# Altium footprint library My Library.PCBLIB: 198 footprints (part 8 of 13)
Each footprint in its own frame and in the unit in brackets; x right, y up, seen from the top. Pads: shape width x height; smd on the part's side, far side on the other; paste and mask are expansions set on the pad; w line width, h text height; cw(c..) or ccw(c..) is an arc to the next point about the centre after c.
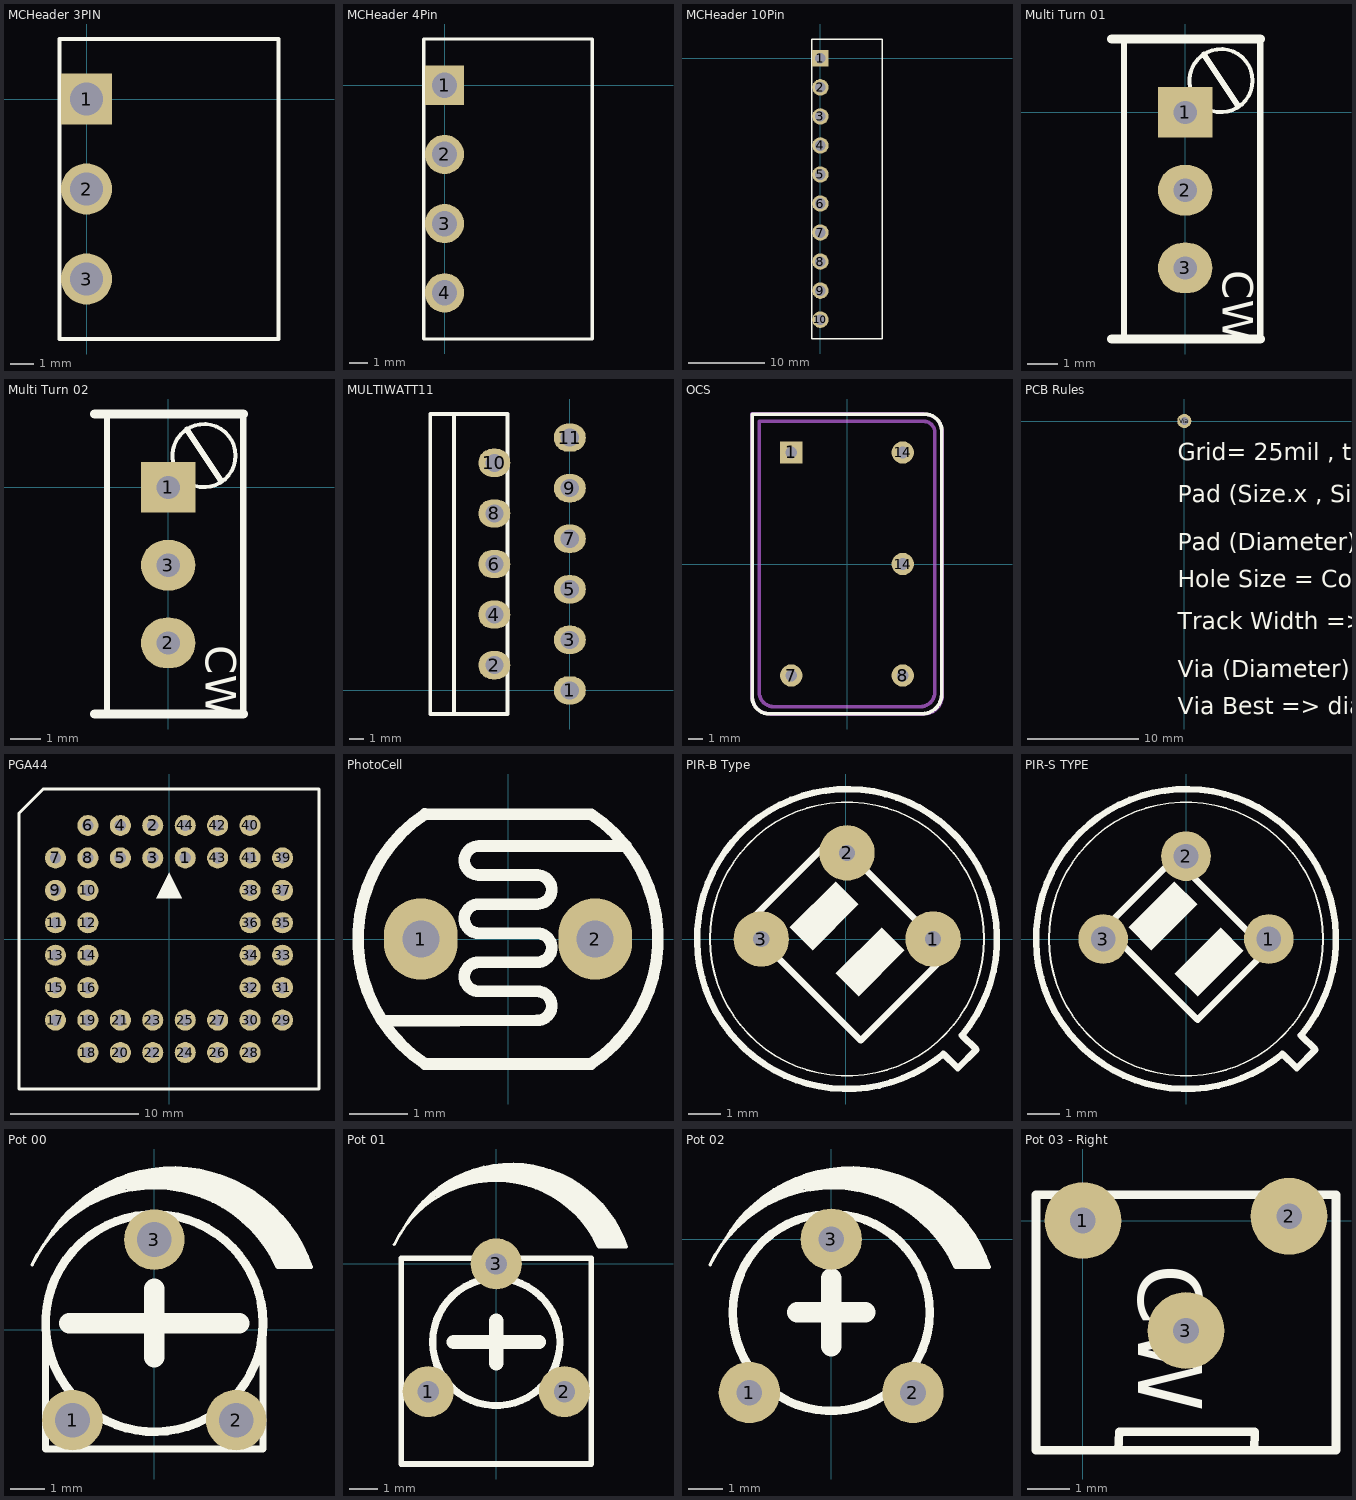
[diagram p7: the footprints below, top view; thin cyan lines are the x and y axes]

## MCHeader 3PIN [mil]
pads (3):
  rect 85x85 hole 55: 1(0,0)
  round 85 hole 55: 2(0,-150) 3(0,-300)
Top Overlay:
  lines w7: -45,-400 -45,100 320,100 320,-400 -45,-400
3D body "mini combicon header 3pin.STEP": height 292.32, standoff -130.12, extent -46.09,-399 318.09,97.85

## MCHeader 4Pin [mil]
pads (4):
  rect 85x85 hole 55: 1(0,0)
  round 85 hole 55: 2(0,-150) 3(0,-300) 4(0,-450)
Top Overlay:
  lines w7: -45,-550 -45,100 320,100 320,-550 -45,-550
3D body "mini combicon header 4pin.STEP": height 292.32, standoff -130.12, extent -49.09,-550.85 315.09,96

## MCHeader 10Pin [mil]
pads (10):
  rect 85x85 hole 55: 1(0,0)
  round 85 hole 55: 2(0,-150) 3(0,-300) 4(0,-450) 5(0,-600) 6(0,-750) 7(0,-900) 8(0,-1050) 9(0,-1200) 10(0,-1350)
Top Overlay:
  lines w7: -45,-1450 320,-1450 320,100 -45,100 -45,-1450
3D body "mini combicon header 10pin.STEP": height 292.32, standoff -130.12, extent -47.09,-1446.85 317.09,100

## Multi Turn 01 [mil] "Stand Multi Turn - Turning CW Increase P1~2 Resistor"
height 472.44
pads (3):
  rect 70x65 hole 30: 1(0,0)
  oval 70x65 hole 30: 2(0,-100) 3(0,-200)
Top Overlay:
  circle w5: c46.03,40.94 r40.58
  lines w7.87: -78.74,-291.34 -78.74,94.49 ; 24.02,74.41 67.72,8.66 ; 96.46,-291.34 96.46,94.49
  lines w11.81: -94.49,-291.34 96.46,-291.34 ; -94.49,94.49 96.46,94.49
  text "CW" at 48,-203 h39.37
3D body "multiturn.STEP": height 452.18, standoff -75.38, extent -73.75,-282.01 92,92.01

## Multi Turn 02 [mil]
pads (3):
  rect 70x65 hole 30: 1(0,0)
  oval 70x65 hole 30: 2(0,-200) 3(0,-100)
Top Overlay:
  circle w5: c46.03,40.94 r40.58
  lines w7.87: -78.74,-291.34 -78.74,94.49 ; 24.02,74.41 67.72,8.66 ; 96.46,-291.34 96.46,94.49
  lines w11.81: -94.49,-291.34 96.46,-291.34 ; -94.49,94.49 96.46,94.49
  text "CW" at 48,-203 h39.37
3D body "multiturn.STEP": height 452.18, standoff -75.38, extent -73.23,-285.04 92.52,88.98

## MULTIWATT11 [mil] "Use For L6203"
height 760
pads (11):
  oval 85x75 hole 48: 1(0,0) 2(-200,67) 3(0,134) 4(-200,201) 5(0,268) 6(-200,335) 7(0,402) 8(-200,469) 9(0,536) 10(-200,603) 11(0,670)
Top Overlay:
  lines w10: -317,732.5 -315,732.5 ; -307,-62.5 -307,732.5 ; -370,-62.5 -165,-62.5 -165,732.5 -370,732.5 -370,-62.5
3D body: height 760, standoff 62, extent -368,-61 -307,731
3D body: height 42, standoff 20, extent -254,-18 11,19
3D body: height 62, standoff 42, extent -254,-18 -232,19
3D body: height 42, standoff 20, extent -254,116 11,153
3D body: height 62, standoff 42, extent -254,116 -232,153
3D body: height 42, standoff 20, extent -254,250 11,287
3D body: height 62, standoff 42, extent -254,250 -232,287
3D body: height 42, standoff 20, extent -254,384 11,421
3D body: height 62, standoff 42, extent -254,384 -232,421
3D body: height 42, standoff 20, extent -254,518 11,555
3D body: height 62, standoff 42, extent -254,518 -232,555
3D body: height 62, standoff 42, extent -254,652 -232,689
3D body: height 42, standoff 20, extent -254,652 11,689
3D body: height 42, standoff 20, extent -254,49 -189,86
3D body: height 62, standoff 42, extent -254,49 -232,86
3D body: height 42, standoff 20, extent -254,183 -189,220
3D body: height 62, standoff 42, extent -254,183 -232,220
3D body: height 42, standoff 20, extent -254,317 -189,354
3D body: height 62, standoff 42, extent -254,317 -232,354
3D body: height 42, standoff 20, extent -254,451 -189,488
3D body: height 62, standoff 42, extent -254,451 -232,488
3D body: height 62, standoff 42, extent -254,585 -232,622
3D body: height 42, standoff 20, extent -254,585 -189,622
3D body: height 20, standoff -40, extent -11,-18 11,19
3D body: height 20, standoff -40, extent -211,49 -189,86
3D body: height 20, standoff -40, extent -11,116 11,153
3D body: height 20, standoff -40, extent -211,183 -189,220
3D body: height 20, standoff -40, extent -11,250 11,287
3D body: height 20, standoff -40, extent -211,317 -189,354
3D body: height 20, standoff -40, extent -11,384 11,421
3D body: height 20, standoff -40, extent -211,451 -189,488
3D body: height 20, standoff -40, extent -11,518 11,555
3D body: height 20, standoff -40, extent -211,585 -189,622
3D body: height 20, standoff -40, extent -11,652 11,689
3D body: height 490, standoff 60, extent -370,-62.5 -165,732.5

## OCS [mil]
pads (5):
  rect 60x60 hole 32: 1(-150,300)
  round 60 hole 32: 7(-150,-300) 8(150,-300) 14(150,0) 14(150,300)
Top Overlay:
  lines w10: -255,-358 ccw(c-210,-358) -210,-403 202,-403 ccw(c202,-350) 255,-350 255,350 255,358 ccw(c210,358) 210,403 -210,403 -255,403 -255,350 -255,-350 -255,-358
Mechanical 1:
  circle w10: c-150,300 r10
  circle w10: c150,300 r10
  circle w10: c150,-300 r10
  circle w10: c-150,-300 r10
  lines w10: -255.91,-354.33 ccw(c-206.69,-354.33) -206.69,-403.54 206.69,-403.54 ccw(c206.69,-354.33) 255.91,-354.33 255.91,354.33 ccw(c206.69,354.33) 206.69,403.54 -255.91,403.54 -255.91,-354.33 ; -236.22,-344.49 ccw(c-196.85,-344.49) -196.85,-383.86 196.85,-383.86 ccw(c196.85,-344.49) 236.22,-344.49 236.22,354.33 ccw(c206.69,354.33) 206.69,383.86 -236.22,383.86 -236.22,-344.49
3D body: height 0, standoff -50, extent 140.02,290.02 159.98,309.98
3D body: height 0, standoff -50, extent -159.98,290.02 -140.02,309.98
3D body: height 0, standoff -50, extent 140.02,-309.98 159.98,-290.02
3D body: height 0, standoff -50, extent -159.98,-309.98 -140.02,-290.02
3D body: height 170, standoff 0, extent -236.2,-383.84 236.2,383.84
3D body: height 30, standoff 0, extent -255.89,-403.52 255.89,403.52

## PCB Rules [mil]
pads (1):
  round 50 hole 28: Via(0,0)
Top Overlay:
  text "Via Best => diameter= 55mil  , hole size= 30mil" at -23,-1035 h60
  text "Via (Diameter) = Hole Size +25" at -23,-905.49 h60
  text "Track Width => min= 10-15mil  ,  good= 20-50mil" at -23,-736 h60
  text "Hole Size = Component Lead + 10" at -23,-586.5 h60
  text "Pad (Diameter)= Hole Size + 25mil" at -23,-456.99 h60
  text "Pad (Size.x , Size.y) = (60-60) , (60-80) , (70-90)" at -23,-287.5 h60
  text "Grid= 25mil , the best= 50mil , Clearance= 10mil" at -23,-138 h60

## PGA44 [mil] "PLCC Socket with 44 Positions"
pads (44):
  round 65 hole 35: 1(50,250) 2(-50,350) 3(-50,250) 4(-150,350) 5(-150,250) 6(-250,350) 7(-350,250) 8(-250,250) 9(-350,150) 10(-250,150) 11(-350,50) 12(-250,50) 13(-350,-50) 14(-250,-50) 15(-350,-150) 16(-250,-150) 17(-350,-250) 18(-250,-350) 19(-250,-250) 20(-150,-350) 21(-150,-250) 22(-50,-350) 23(-50,-250) 24(50,-350) 25(50,-250) 26(150,-350) 27(150,-250) 28(250,-350) 29(350,-250) 30(250,-250) 31(350,-150) 32(250,-150) 33(350,-50) 34(250,-50) 35(350,50) 36(250,50) 37(350,150) 38(250,150) 39(350,250) 40(250,350) 41(250,250) 42(150,350) 43(150,250) 44(50,350)
Top Overlay:
  region: 0,205 40,125 -40,125
  lines w10: -462.5,-462.5 -462.5,387.5 -387.5,462.5 462.5,462.5 462.5,-462.5 -462.5,-462.5
3D body "Full PLCC 44 Socket.STEP": height 312.16, standoff -86.4, extent -462.5,-462.5 462.5,462.5

## PhotoCell [mil]
pads (2):
  oval 50x55 hole 25: 1(-59.06,0) 2(59.06,0)
Top Overlay:
  lines w7.87: -85.04,-55.51 19.68,-55.12 ccw(c19.75,-45.28) 19.71,-35.43 -19.68,-35.43 cw(c-19.75,-25.59) -19.69,-15.75 19.68,-15.75 ccw(c19.75,-5.91) 19.71,3.94 -19.68,3.94 cw(c-19.75,13.78) -19.69,23.62 19.68,23.62 ccw(c19.75,33.46) 19.71,43.31 -19.66,43.31 ; -56.3,-84.65 56.25,-84.65 ; -56.3,84.65 56.25,84.58 cw(c0,0) 56.22,-84.6 ; -56.25,-84.58 cw(c0,0) -56.25,84.58 ; -19.68,43.31 cw(c-19.73,53.15) -19.66,62.99 79.92,62.99
3D body "LDR.STEP": height 96.06, standoff -90.55, extent -102.56,-85 102.56,84.29

## PIR-B Type [mm] "For D203B and D204B PIR Sensors"
height 4.7
pads (3):
  round 1.7 hole 0.5: 1(2.68,0) 2(0.04,2.64) 3(-2.59,0)
Top Overlay:
  circle w0.05: c0.04,0 r4.2
  region: -0.309,1.772 -1.723,0.358 -1.016,-0.349 0.398,1.065
  region: 1.105,0.358 -0.309,-1.056 0.398,-1.763 1.812,-0.349
  lines w0.2: -3.071,0.424 0.464,-3.111 3.151,-0.424 -0.384,3.111 -3.071,0.424 ; 2.997,-3.524 cw(c0.04,0) 3.564,-2.957 4.01,-3.39 3.44,-3.96 2.997,-3.524

## PIR-S TYPE [mil] "For D203S and D204S PIR Sensors"
height 185.04
pads (3):
  round 60 hole 30: 1(100,0) 2(0,100) 3(-100,0)
Top Overlay:
  circle w1.97: c0,0 r165.35
  region: 41.76,13.92 -13.92,-41.76 13.92,-69.6 69.59,-13.92
  region: -13.92,69.6 -69.6,13.92 -41.76,-13.92 13.92,41.76
  lines w7.87: -97.44,13.92 -13.92,97.44 97.44,-13.92 13.92,-97.44 -97.44,13.92 ; 116.41,-138.73 cw(c0,0) 138.73,-116.41 156.3,-133.46 133.86,-155.91 116.41,-138.73
Mechanical 1:
  lines w7.87: 138.67,-116.36 139.19,-116.36
3D body "PIR_S_Orginal.STEP": height 185.04, standoff -78.74, extent -178.63,-177.59 179.64,179.49

## Pot 00 [mil]
height 185.04
pads (3):
  round 70 hole 40: 1(-94.49,-104.33) 2(94.49,-104.33) 3(0,104.33)
Top Overlay:
  circle w10: c0,7.87 r125.59
  lines w3.94: -141.04,75.24 cw(c0,7.87) 142.47,72.16 180.95,72.15 ; -124.67,102.67 cw(c21.51,18.33) 181.5,72.05 ; -108.27,123.33 -97.64,133.07 ; -100.39,133.86 -94.88,133.86 ; -97.64,136.61 -90.16,136.61 ; -94.49,140.16 -85.04,140.16 ; -90.94,143.7 -79.13,143.7 ; -85.83,147.24 -72.05,147.24 ; -82.28,150.79 -64.17,150.79 ; -77.17,154.33 -56.69,154.33 ; -73.62,157.48 -46.06,157.48 ; -67.72,161.02 -34.25,161.02 ; -62.6,164.57 104.22,164.57 ; -55.51,168.11 97.93,168.11 ; -49.21,171.26 91.23,171.65 ; -42.13,174.41 84.15,174.8 ; -33.07,177.95 75.48,177.95 ; -20.47,181.5 61.7,181.5 ; -6.69,183.86 48.71,183.86 ; 31.89,161.02 110.13,161.02 ; 45.67,157.48 115.64,157.48 ; 55.51,153.94 120.37,153.94 ; 64.96,150.39 125.09,150.39 ; 72.44,146.85 129.42,146.85 ; 84.25,139.76 136.9,139.76 ; 90.55,136.22 140.84,136.22 ; 100,129.13 146.35,129.13 ; 108.66,122.44 152.65,122.44 ; 115.35,114.96 156.19,114.96 ; 120.08,112.2 158.56,112.2 ; 121.65,109.45 160.13,109.45 ; 124.02,106.69 162.49,106.69 ; 126.38,103.54 164.85,103.54 ; 130.71,96.06 169.19,96.06 ; 133.46,92.52 171.94,92.52 ; 134.65,88.98 173.12,88.98 ; 136.61,85.43 175.09,85.43 ; 137.8,82.28 176.27,82.28 ; 139.76,78.74 178.24,78.74 ; 140.94,75.59 179.42,75.59
  lines w4.72: 78.74,143.31 134.15,143.31 ; 95.28,132.68 143.99,132.68 ; 105.51,125.98 149.5,125.98 ; 111.02,118.9 155.01,118.9
  lines w5.91: 128.35,100 166.82,100
  lines w7.87: -125.59,15.75 -125.59,-137.8 125.59,-137.8 125.59,15.75
  lines w23.62: -98.43,7.87 98.43,7.87 ; 0,-31.5 0,47.24
3D body "pot.STEP": height 183.07, standoff -62.99, extent -124.8,-144.09 127.1,145.24

## Pot 01 [mm]
height 6.25
pads (3):
  round 1.8 hole 0.75: 1(-2.4,-4.5) 2(2.4,-4.5) 3(0,0)
Top Overlay:
  circle w0.254: c0,-2.75 r2.24
  lines w0.1: -3.601,0.678 cw(c-0.019,-1.033) 3.6,0.6 4.577,0.6 ; -3.185,1.375 cw(c0.527,-0.767) 4.591,0.597 ; -2.769,1.9 -2.499,2.147 ; -2.569,2.167 -2.429,2.167 ; -2.499,2.237 -2.309,2.237 ; -2.419,2.327 -2.179,2.327 ; -2.329,2.417 -2.029,2.417 ; -2.199,2.507 -1.849,2.507 ; -2.109,2.597 -1.649,2.597 ; -1.979,2.687 -1.459,2.687 ; -1.889,2.767 -1.189,2.767 ; -1.739,2.857 -0.889,2.857 ; -1.609,2.947 2.629,2.947 ; -1.429,3.037 2.469,3.037 ; -1.269,3.117 2.299,3.127 ; -1.089,3.197 2.119,3.207 ; -0.859,3.287 1.899,3.287 ; -0.539,3.377 1.549,3.377 ; -0.189,3.437 1.219,3.437 ; 0.791,2.857 2.779,2.857 ; 1.141,2.767 2.919,2.767 ; 1.391,2.677 3.039,2.677 ; 1.631,2.587 3.159,2.587 ; 1.821,2.497 3.269,2.497 ; 2.121,2.317 3.459,2.317 ; 2.281,2.227 3.559,2.227 ; 2.521,2.047 3.699,2.047 ; 2.741,1.877 3.859,1.877 ; 2.911,1.687 3.949,1.687 ; 3.031,1.617 4.009,1.617 ; 3.071,1.547 4.049,1.547 ; 3.131,1.477 4.109,1.477 ; 3.191,1.397 4.169,1.397 ; 3.301,1.207 4.279,1.207 ; 3.371,1.117 4.349,1.117 ; 3.401,1.027 4.379,1.027 ; 3.451,0.937 4.429,0.937 ; 3.481,0.857 4.459,0.857 ; 3.531,0.767 4.509,0.767 ; 3.561,0.687 4.539,0.687
  lines w0.12: 1.981,2.407 3.389,2.407 ; 2.401,2.137 3.639,2.137 ; 2.661,1.967 3.779,1.967 ; 2.801,1.787 3.919,1.787
  lines w0.15: 3.241,1.307 4.219,1.307
  lines w0.2: -3.35,-7.05 3.35,-7.05 3.35,0.2 -3.35,0.2 -3.35,-7.05
  lines w0.5: -1.5,-2.75 1.5,-2.75 ; 0,-3.5 0,-2

## Pot 02 [mm]
height 7.5
pads (3):
  round 1.8 hole 0.75: 1(-2.4,-4.5) 2(2.4,-4.5) 3(0,0)
Top Overlay:
  circle w0.254: c0,-2.15 r2.89
  lines w0.1: -3.55,-0.75 cw(c0.032,-2.461) 3.651,-0.828 4.628,-0.828 ; -3.134,-0.053 cw(c0.579,-2.196) 4.642,-0.831 ; -2.718,0.472 -2.448,0.719 ; -2.518,0.739 -2.378,0.739 ; -2.448,0.809 -2.258,0.809 ; -2.368,0.899 -2.128,0.899 ; -2.278,0.989 -1.978,0.989 ; -2.148,1.079 -1.798,1.079 ; -2.058,1.169 -1.598,1.169 ; -1.928,1.259 -1.408,1.259 ; -1.838,1.339 -1.138,1.339 ; -1.688,1.429 -0.838,1.429 ; -1.558,1.519 2.68,1.519 ; -1.378,1.609 2.52,1.609 ; -1.218,1.689 2.35,1.699 ; -1.038,1.769 2.17,1.779 ; -0.808,1.859 1.95,1.859 ; -0.488,1.949 1.6,1.949 ; -0.138,2.009 1.27,2.009 ; 0.842,1.429 2.83,1.429 ; 1.192,1.339 2.97,1.339 ; 1.442,1.249 3.09,1.249 ; 1.682,1.159 3.21,1.159 ; 1.872,1.069 3.32,1.069 ; 2.172,0.889 3.51,0.889 ; 2.332,0.799 3.61,0.799 ; 2.572,0.619 3.75,0.619 ; 2.792,0.449 3.91,0.449 ; 2.962,0.259 4,0.259 ; 3.082,0.189 4.06,0.189 ; 3.122,0.119 4.1,0.119 ; 3.182,0.049 4.16,0.049 ; 3.242,-0.031 4.22,-0.031 ; 3.352,-0.221 4.33,-0.221 ; 3.422,-0.311 4.4,-0.311 ; 3.452,-0.401 4.43,-0.401 ; 3.502,-0.491 4.48,-0.491 ; 3.532,-0.571 4.51,-0.571 ; 3.582,-0.661 4.56,-0.661 ; 3.612,-0.741 4.59,-0.741
  lines w0.12: 2.032,0.979 3.44,0.979 ; 2.452,0.709 3.69,0.709 ; 2.712,0.539 3.83,0.539 ; 2.852,0.359 3.97,0.359
  lines w0.15: 3.292,-0.121 4.27,-0.121
  lines w0.6: -1,-2.15 1,-2.15 ; 0,-3.15 0,-1.15

## Pot 03 - Right [mm]
height 7.85
pads (3):
  round 1.8 hole 0.6: 1(0,0) 2(4.83,0.1) 3(2.415,-2.58)
Top Overlay:
  lines w0.2: 0.83,-5.38 0.85,-4.95 4.03,-4.95 4.01,-5.38 ; -1.1,-5.38 5.93,-5.38 5.93,0.6 -1.1,0.6 -1.1,-5.38
  text "CW" at 1.295,-1.03 h1.5